# Altium footprint library PIF_PCB_Lib.PcbLib: 112 footprints (part 4 of 7)
Each footprint in its own frame and in the unit in brackets; x right, y up, seen from the top. Pads: shape width x height; smd on the part's side, far side on the other; paste and mask are expansions set on the pad; w line width, h text height; cw(c..) or ccw(c..) is an arc to the next point about the centre after c.
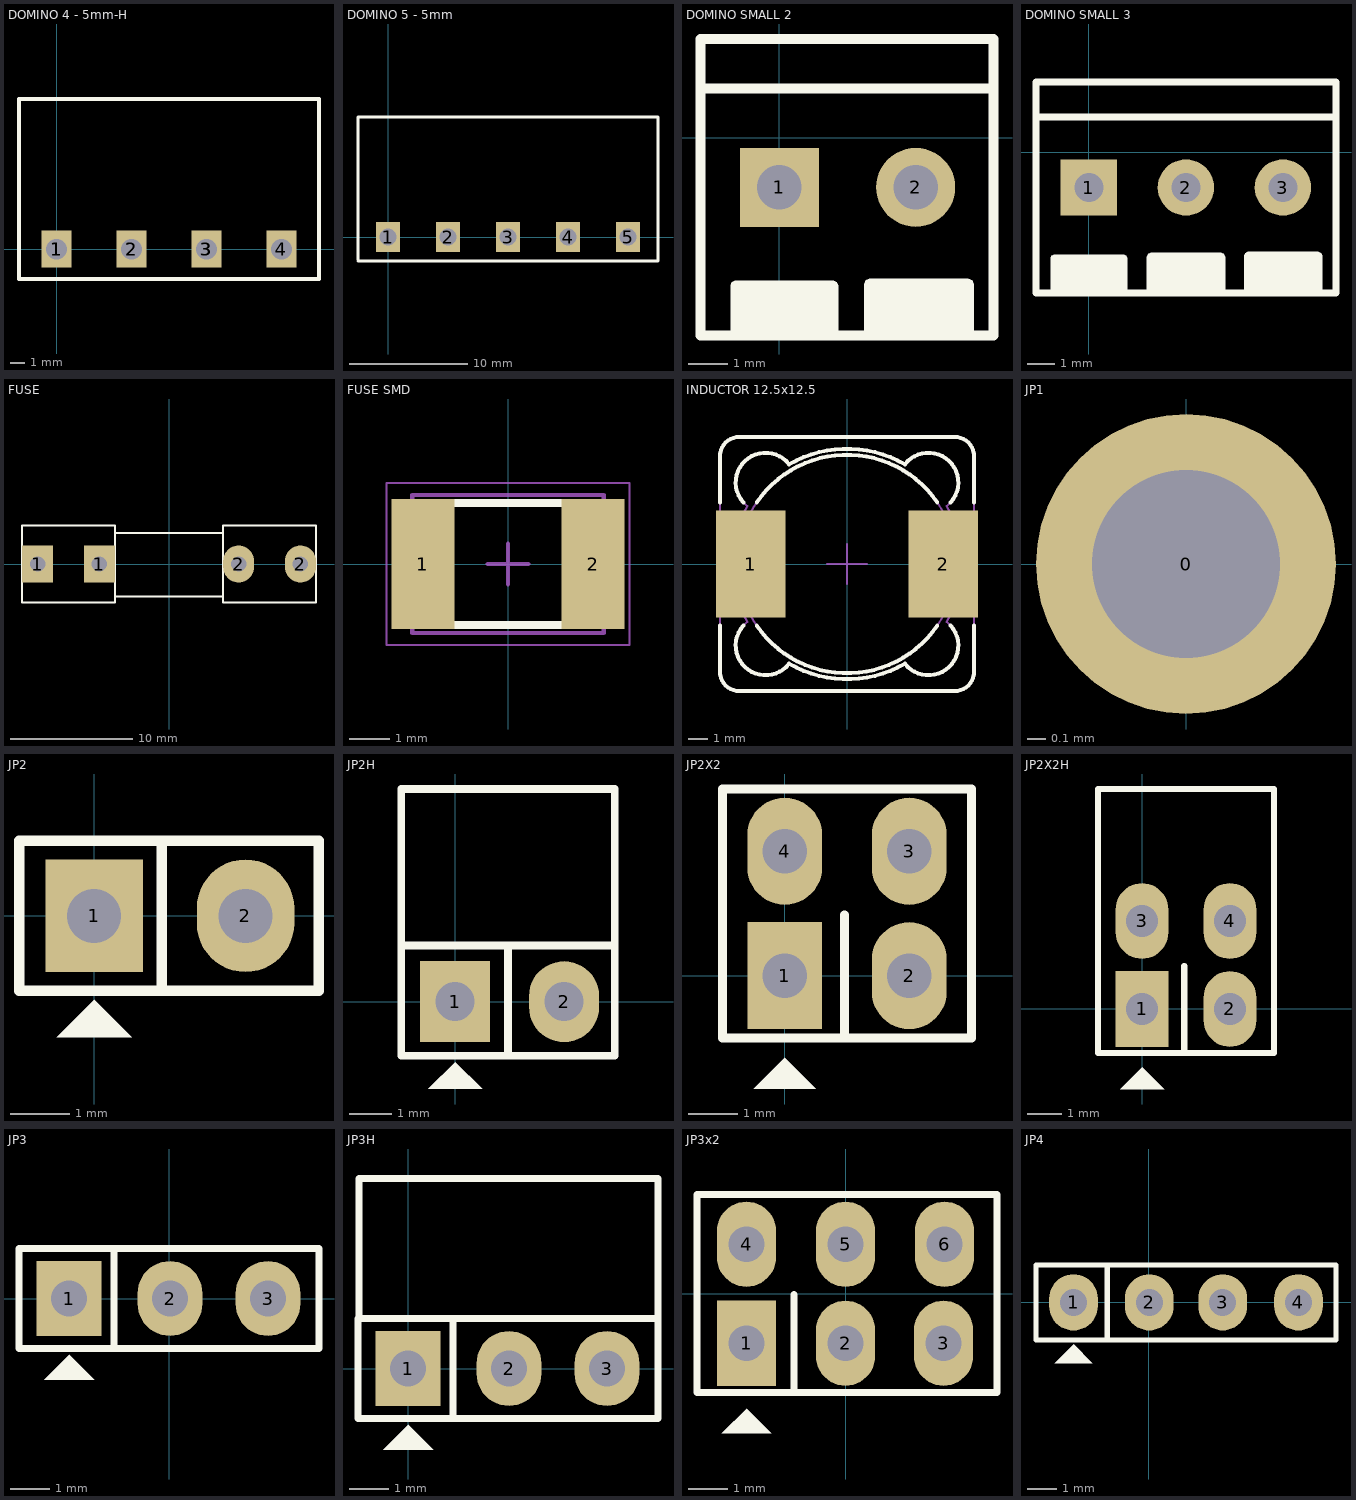
[diagram p3: the footprints below, top view; thin cyan lines are the x and y axes]

## DOMINO 4 - 5mm-H [mm]
pads (7):
  rect 2x2.5 hole 1.4: 1(0,0) 1(0,0) 2(5.08,0) 2(5.08,0) 3(10.16,0) 3(10.173,0) 4(15.24,0)
Top Overlay:
  lines w0.254: 12.713,-2.032 -2.54,-2.032 7.62,-2.032 17.78,-2.032 17.78,10.173 -2.527,10.173 -2.54,10.173 -2.54,-1.905 -2.54,10.16 ; 12.713,10.16 -2.54,10.16 ; 17.78,10.16 -2.54,10.16
3D body "User Library-BigHeader 5EHDR_1P.step": height 3.15, standoff -9.32, extent -2.5,-1.75 2.5,10.25
3D body "User Library-BigHeader 5EHDR_1P.step": height 3.15, standoff -9.32, extent 2.58,-1.75 7.58,10.25
3D body "User Library-BigHeader 5EHDR_1P.step": height 3.15, standoff -9.32, extent 7.66,-1.75 12.66,10.25
3D body "User Library-BigHeader 5EHDR_1P.step": height 3.15, standoff -9.32, extent 12.74,-1.75 17.74,10.25

## DOMINO 5 - 5mm [mm]
pads (5):
  rect 2x2.5 hole 1.4: 1(0,0) 2(5.08,0) 3(10.16,0) 4(15.24,0) 5(20.32,0)
Top Overlay:
  lines w0.254: -2.54,-2.032 7.62,-2.032 22.86,-2.032 22.86,10.16 ; -2.54,-1.905 -2.54,10.16 ; -2.54,10.16 6.248,10.16 22.86,10.16 ; -2.54,10.16 22.86,10.16
3D body "User Library-BigHeader 5EHDR_1P.step": height 3.15, standoff -9.32, extent 17.82,-1.75 22.82,10.25
3D body "User Library-BigHeader 5EHDR_1P.step": height 3.15, standoff -9.32, extent 12.74,-1.75 17.74,10.25
3D body "User Library-BigHeader 5EHDR_1P.step": height 3.15, standoff -9.32, extent 7.66,-1.75 12.66,10.25
3D body "User Library-BigHeader 5EHDR_1P.step": height 3.15, standoff -9.32, extent 2.58,-1.75 7.58,10.25
3D body "User Library-BigHeader 5EHDR_1P.step": height 3.15, standoff -9.32, extent -2.5,-1.75 2.5,10.25

## DOMINO SMALL 2 [mil] "3.5 mm"
pads (2):
  rect 80x80 hole 45: 1(0,-50)
  round 80 hole 45: 2(137.8,-50)
Top Overlay:
  region: 58.01,-145.99 59.26,-149 59.26,-199 58.01,-202.01 55,-203.26 -45,-203.26 -48.01,-202.01 -49.26,-199 -49.26,-149 -48.01,-145.99 -45,-144.74 55,-144.74
  region: 194.83,-144.17 196.41,-148 196.41,-198 194.83,-201.83 191,-203.41 91,-203.41 87.17,-201.83 85.59,-198 85.59,-148 87.17,-144.17 91,-142.59 191,-142.59
  lines w7: -45,-199 -45,-149 55,-149 55,-199 -45,-199 ; 91,-198 91,-148 191,-148 191,-198 91,-198
  lines w10: -80,50 215,50 ; -80,-200 216.64,-200 216.64,100 -80,100 -80,-200
3D body "37875.stp": height 335.13, standoff -137.31, extent -78.64,-192 216.64,95.4

## DOMINO SMALL 3 [mil]
pads (3):
  rect 80x80 hole 41: 1(0,-50)
  round 80 hole 41: 2(137.8,-50) 3(275.59,-50)
Top Overlay:
  region: 191.83,-144.17 193.41,-148 193.41,-198 191.83,-201.83 188,-203.41 88,-203.41 84.17,-201.83 82.59,-198 82.59,-148 84.17,-144.17 88,-142.59 188,-142.59
  region: 53.01,-146.99 54.26,-150 54.26,-200 53.01,-203.01 50,-204.26 -50,-204.26 -53.01,-203.01 -54.26,-200 -54.26,-150 -53.01,-146.99 -50,-145.74 50,-145.74
  region: 329.83,-143.17 331.41,-147 331.41,-197 329.83,-200.83 326,-202.41 226,-202.41 222.17,-200.83 220.59,-197 220.59,-147 222.17,-143.17 226,-141.59 326,-141.59
  lines w7: -50,-200 50,-200 50,-150 -50,-150 -50,-200 ; 88,-198 188,-198 188,-148 88,-148 88,-198 ; 226,-197 326,-197 326,-147 226,-147 226,-197
  lines w10: -75,50 351,50 ; -75,-200 -75,100 351,100 351,-200 -75,-200
3D body "37876.stp": height 335.13, standoff -137.31, extent -78.07,-193.4 355,94

## FUSE [mil] "De Fuse"
pads (4):
  rect 100x120 hole 50: 1(-425,0) 1(-225,0)
  oval 100x120 hole 50: 2(225,0) 2(425,0)
Top Overlay:
  lines w7: -175,-105 175,-105 ; -175,100 175,100 ; -475,-125 -175,-125 -175,125 -475,125 -475,-125 ; 175,-125 175,125 475,125 475,-125 175,-125
3D body "SW3dPS-Fuse Leg_2009.STEP": height 377.88, standoff -129.94, extent -448,-117 -208,126.71
3D body "SW3dPS-Fuse Small 1A.STEP": height 370.39, standoff 169.61, extent -384.8,-98 390.8,102.79
3D body "SW3dPS-Fuse Leg_2009.STEP": height 377.88, standoff -129.94, extent 219,-116.71 459,127

## FUSE SMD [mm] "SMD FUSE"
height 0.75
pads (2):
  rect 1.55x3.21 smd: 1(-2.1,0) 2(2.1,0)
Top Overlay:
  lines w0.2: -1.35,-1.505 1.35,-1.505 ; -1.35,1.505 1.35,1.505
Mechanical 13:
  lines w0.1: -2.365,-1.705 2.365,-1.705 2.365,1.705 -2.365,1.705 -2.365,-1.705
Mechanical 15:
  lines w0.05: -3,-2 3,-2 3,2 -3,2 -3,-2
  lines w0.1: -0.5,0 0.5,0 ; 0,-0.5 0,0.5
3D body: height 0.75, standoff 0, extent 1.965,-1.705 2.365,1.705
3D body: height 0.75, standoff 0, extent -2.365,-1.705 -1.965,1.705
3D body: height 0.75, standoff 0, extent -1.965,-1.705 1.965,1.705

## INDUCTOR 12.5x12.5 [mm] "SMD Inductor  Body Width 12.5mm Body Lenght 12.5mm Height 8mm"
height 8
pads (2):
  rect 3.5x5.4 smd: 1(-4.85,0) 2(4.85,0)
Top Overlay:
  lines w0.2: -6.4,-3.1 -6.4,-5.4 ccw(c-5.4,-5.4) -5.4,-6.4 5.4,-6.4 ccw(c5.4,-5.4) 6.4,-5.4 6.4,-3.1 ; -6.4,3.1 -6.4,5.4 cw(c-5.4,5.4) -5.4,6.4 5.4,6.4 cw(c5.4,5.4) 6.4,5.4 6.4,3.1 ; -5.218,-3.1 ccw(c-4.101,-4.101) -2.912,-5.016 ccw(c0,0) 2.912,-5.016 ccw(c4.101,-4.101) 5.218,-3.1 ; -5.218,3.1 cw(c-4.101,4.101) -2.912,5.016 cw(c0,0) 2.912,5.016 cw(c4.101,4.101) 5.218,3.1 ; -4.543,-3.1 ccw(c0,0) 4.543,-3.1 ; -4.543,3.1 cw(c0,0) 4.543,3.1
Mechanical 8:
  lines w0.1: -5.85,0 -4.85,0 ; -4.85,-1 -4.85,0 ; -4.85,1 -4.85,0 ; -3.85,0 -4.85,0 ; -1,0 0,0 ; 0,-1 0,0 ; 0,1 0,0 ; 1,0 0,0 ; 3.85,0 4.85,0 ; 4.85,-1 4.85,0 ; 4.85,1 4.85,0 ; 5.85,0 4.85,0
Mechanical 14:
  circle w0.1: c0,0 r5.5
  lines w0.1: -6.4,-5.4 ccw(c-5.4,-5.4) -5.4,-6.4 5.4,-6.4 ccw(c5.4,-5.4) 6.4,-5.4 6.4,5.4 ccw(c5.4,5.4) 5.4,6.4 -5.4,6.4 ccw(c-5.4,5.4) -6.4,5.4 -6.4,-5.4 ; -5.016,-2.912 ccw(c-4.101,-4.101) -2.912,-5.016 ccw(c0,0) 2.912,-5.016 ccw(c4.101,-4.101) 5.016,-2.912 ccw(c0,0) 5.016,2.912 ccw(c4.101,4.101) 2.912,5.016 ccw(c0,0) -2.912,5.016 ccw(c-4.101,4.101) -5.016,2.912 ccw(c0,0) -5.016,-2.912
3D body "IND_BOURNS_PM127SH.stp": height 8, standoff 0, extent -6.4,-6.4 6.4,6.4

## JP1 [mm]
pads (1):
  round 1.6 hole 1: 0(0,0)

## JP2 [mil]
pads (2):
  rect 65x75 hole 36: 1(0,0)
  oval 65x75 hole 36: 2(101,0)
Top Overlay:
  region: 0,-56 -25,-81 25,-81
  lines w7: 45,-50 45,49 ; -50,-50 150,-50 150,50 -50,50 -50,-50
3D body "JP2.stp": height 323.44, standoff -117.51, extent -48.03,-50 148.03,48.43

## JP2H [mil]
pads (2):
  rect 65x75 hole 36: 1(0,0)
  oval 65x75 hole 36: 2(101,0)
Top Overlay:
  region: 0,-56 -25,-81 25,-81
  lines w7: 49,-50 49,49 ; 148,54 148,197 -50,197 -50,52 ; -50,52 -50,-50 148,-50 148,52 -50,52
3D body "JP2H.stp": height 99.03, standoff -93.89, extent -44.13,-14.29 148,424.29

## JP2X2 [mil]
pads (4):
  rect 60x86 hole 36: 1(0,0)
  oval 60x86 hole 36: 2(100,0) 3(100,100) 4(0,100)
Top Overlay:
  region: 0,-66 -25,-91 25,-91
  lines w7: 48,-50 48,49 ; -50,-50 -50,50 -50,150 150,150 150,-50 -50,-50
3D body "JP2X2.stp": height 335.25, standoff -117.51, extent -49.99,-49.99 150.01,150.01

## JP2X2H [mil]
pads (4):
  rect 60x86 hole 36: 1(0,0)
  oval 60x86 hole 36: 2(100,0) 3(0,100) 4(100,100)
Top Overlay:
  region: 0,-66 -25,-91 25,-91
  lines w7: 48,-50 48,49 ; -50,-50 -50,50 -50,250 150,250 150,-50 -50,-50
3D body "4 cong cong.stp": height 197.45, standoff -117.51, extent -50,-13.54 150,493.54

## JP3 [mil] "Jumper 3"
height 200
pads (3):
  rect 65x75 hole 36: 1(-100,0)
  oval 65x75 hole 36: 2(1,0) 3(99,0)
Top Overlay:
  region: -100,-56 -125,-81 -75,-81
  lines w7: -55,-50 -55,49 ; -150,-50 150,-50 150,50 -150,50 -150,-50
3D body "User Library-PinHeaderX3.STEP": height 355.04, standoff -124.88, extent -150,-59.96 150,55

## JP3H [mil]
pads (3):
  rect 65x75 hole 36: 1(0,0)
  oval 65x75 hole 36: 2(101,0) 3(199,0)
Top Overlay:
  region: 0,-56 -25,-81 25,-81
  lines w7: 45,-50 45,49 ; -50,50 -49,50 -49,190 250,190 250,50 ; -50,50 250,50 ; -50,50 -50,-50 250,-50 250,50
3D body "JP3H.stp": height 99.03, standoff -93.89, extent -47.07,-14.96 245.06,423.62

## JP3x2 [mil] "Connector 3x2"
height 200
pads (6):
  rect 60x86 hole 36: 1(-100,-50)
  oval 60x86 hole 36: 2(0,-50) 3(99,-50) 4(-100,50) 5(0,50) 6(100,50)
Top Overlay:
  region: -100,-116 -125,-141 -75,-141
  lines w7: -52,-100 -52,-1 ; -150,-100 -150,0 -150,100 153,100 153,-100 -150,-100
3D body "JP2-3.stp": height 335.24, standoff -117.51, extent -149.99,-100 150.01,100

## JP4 [mil] "Jumper 4"
height 200
pads (4):
  oval 65x75 hole 36: 1(-100,0) 2(1,0) 3(99,0) 4(200,0)
Top Overlay:
  region: -100,-56 -125,-81 -75,-81
  lines w7: -55,-50 -55,49 ; -150,-50 250,-50 250,50 -150,50 -150,-50
3D body "JP4.stp": height 323.44, standoff -117.51, extent -148.03,-48.43 248.03,50